# Altium footprint library UWRT_Footprint_Library_2020.PcbLib: 376 footprints (part 5 of 24)
Each footprint in its own frame and in the unit in brackets; x right, y up, seen from the top. Pads: shape width x height; smd on the part's side, far side on the other; paste and mask are expansions set on the pad; w line width, h text height; cw(c..) or ccw(c..) is an arc to the next point about the centre after c.
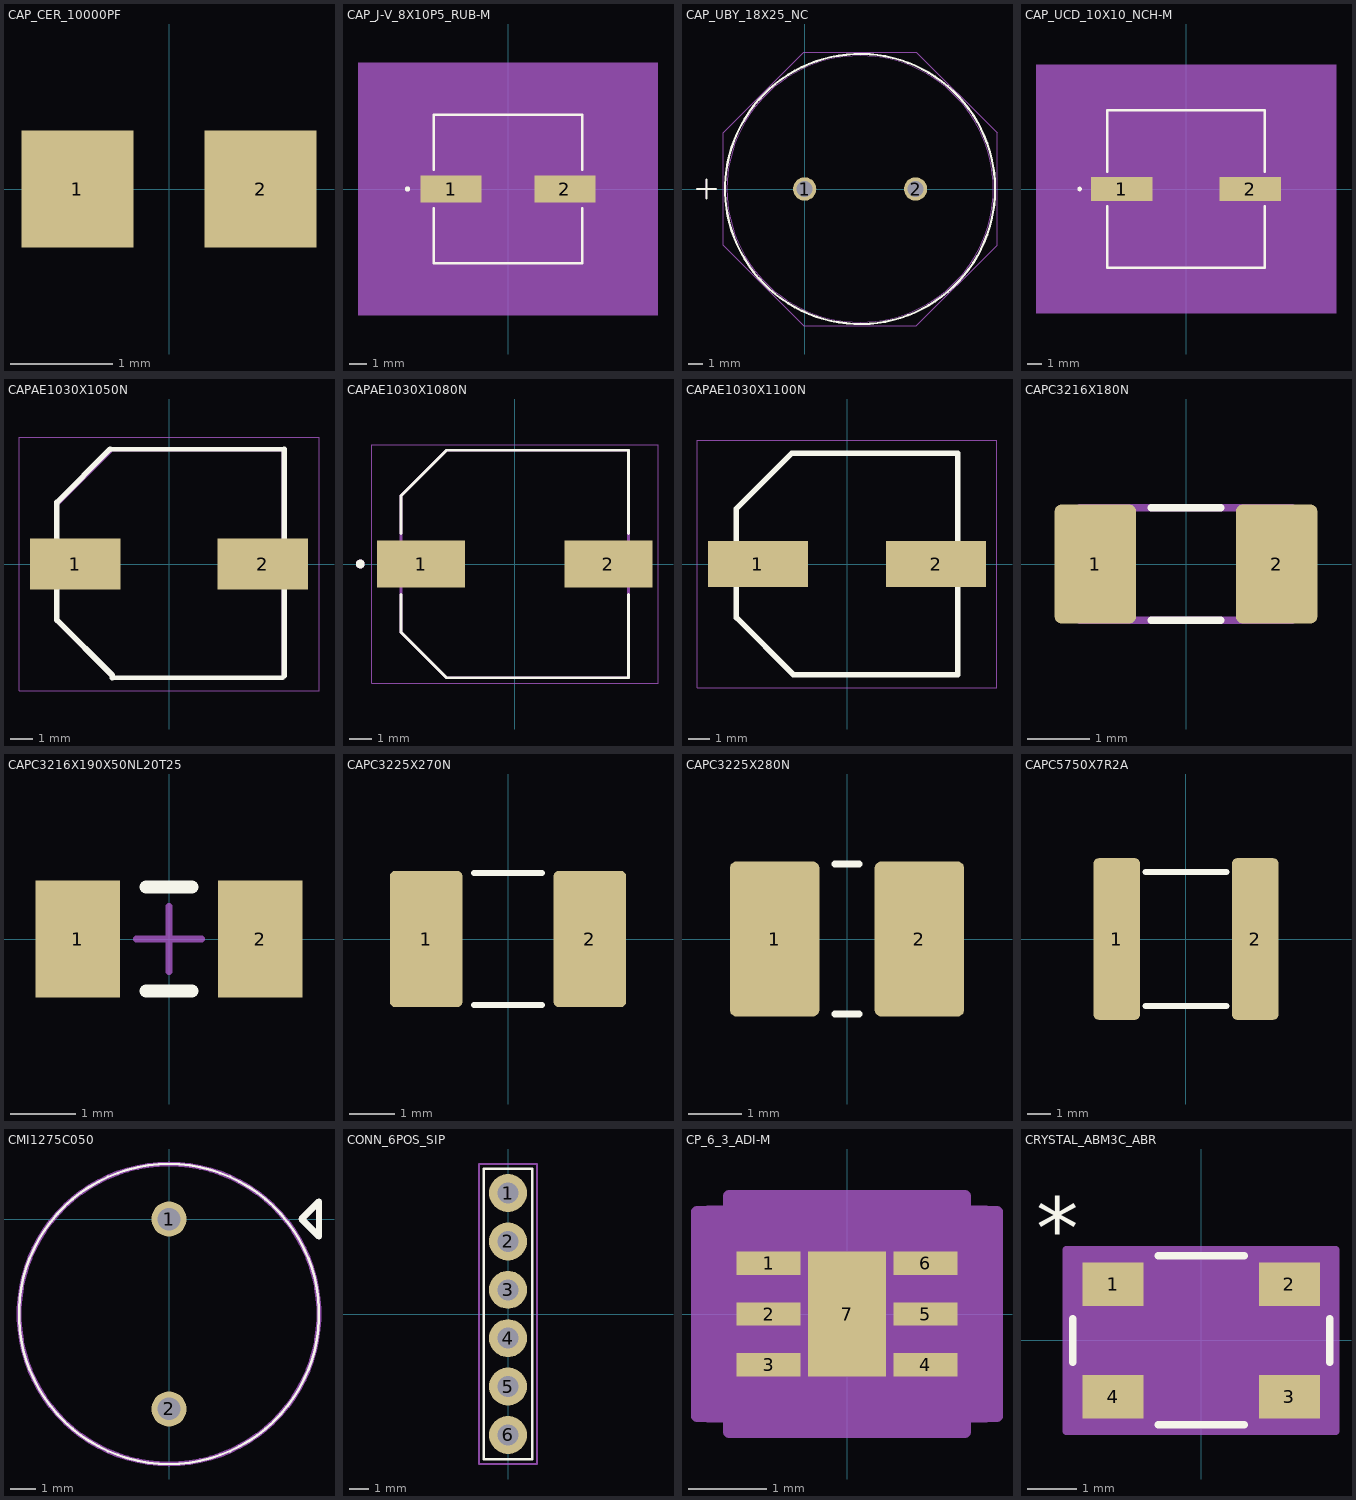
[diagram p4: the footprints below, top view; thin cyan lines are the x and y axes]

## CAP_CER_10000PF [mm] "CAP CER 10000PF 200V X7R 0603"
pads (2):
  rect 1.1x1.15 smd: 1(-0.9,0) 2(0.9,0)
3D body "C0603C103K2RECTU.step": height 0.96, standoff 0.01, extent -0.9,-0.445 0.85,0.425

## CAP_J-V_8X10P5_RUB-M [mil]
pads (2):
  rect 142x63 smd paste+0 mask+0: 1(-132,0) 2(132,0)
Top Overlay:
  circle w6: c-233,0 r3
  lines w6: -172.5,-44.6 -172.5,-172.5 172.5,-172.5 172.5,-44.6 ; -172.5,44.6 -172.5,172.5 172.5,172.5 172.5,44.6
Mechanical 5:
  region: 348,-292.5 -348,-292.5 -348,292.5 348,292.5
Mechanical 13:
  circle w0: c-147.5,0 r3
  lines w1: -167.5,-83.75 -83.75,-167.5 ; -167.5,83.75 -83.75,167.5 ; -167.5,-167.5 167.5,-167.5 167.5,167.5 -167.5,167.5 -167.5,-167.5
Mechanical 15:
  region: -187.5,-51.5 -223,-51.5 -223,51.5 -187.5,51.5 -187.5,187.5 187.5,187.5 187.5,51.5 223,51.5 223,-51.5 187.5,-51.5 187.5,-187.5 -187.5,-187.5
  lines w6: -223,-51.5 -223,51.5 -187.5,51.5 -187.5,187.5 187.5,187.5 187.5,51.5 223,51.5 223,-51.5 187.5,-51.5 187.5,-187.5 -187.5,-187.5 -187.5,-51.5 -223,-51.5
3D body "CAP_J-V_8X10P5_RUB.step": height 415.12, standoff 0, extent -175,-167.48 175,167.48

## CAP_UBY_18X25_NC [mil]
pads (2):
  round 62 hole 42 mask+0: 1(0,0) 2(295.28,0)
Top Overlay:
  circle w6: c147.64,0 r359.5
  lines w6: -286.55,0 -236.55,0 ; -261.55,-25 -261.55,25
Mechanical 13:
  circle w0: c147.64,0 r354.5
  lines w1: -261.55,-25 -261.55,25
Mechanical 15:
  lines w1: -216.86,-150.09 -216.86,150.09 -2.45,364.5 297.73,364.5 512.14,150.09 512.14,-150.09 297.73,-364.5 -2.45,-364.5 -216.86,-150.09
3D body: height 10, standoff 0, extent 0,0 10,10
3D body "CAP_UBY_18X25_NCH.step": height 1043.62, standoff -195.98, extent -207.46,-354.34 502.14,354.35

## CAP_UCD_10X10_NCH-M [mil]
pads (2):
  rect 162x63 smd paste+0 mask+0: 1(-169.5,0) 2(169.5,0)
Top Overlay:
  circle w6: c-280.5,0 r3
  lines w6: -208,-44.6 -208,-208 208,-208 208,-44.6 ; -208,44.6 -208,208 208,208 208,44.6
Mechanical 5:
  region: 395.5,-328 -395.5,-328 -395.5,328 395.5,328
Mechanical 13:
  circle w0: c-183,0 r3
  lines w1: -203,-101.5 -101.5,-203 ; -203,101.5 -101.5,203 ; -203,-203 203,-203 203,203 -203,203 -203,-203
Mechanical 15:
  region: -223,-51.5 -270.5,-51.5 -270.5,51.5 -223,51.5 -223,223 223,223 223,51.5 270.5,51.5 270.5,-51.5 223,-51.5 223,-223 -223,-223
  lines w6: -270.5,-51.5 -270.5,51.5 -223,51.5 -223,223 223,223 223,51.5 270.5,51.5 270.5,-51.5 223,-51.5 223,-223 -223,-223 -223,-51.5 -270.5,-51.5
3D body "CAP_UCD_10X10_NCH.step": height 415.12, standoff 0, extent -222.48,-202.99 222.48,202.99

## CAPAE1030X1050N [mm]
pads (2):
  rect 4.1x2.3 smd: 1(-4.25,0) 2(4.25,0)
Top Overlay:
  lines w0.2: -2.667,5.207 5.227,5.207 ; -2.575,-5.15 5.15,-5.15
  lines w0.254: -2.667,5.207 -5.08,2.794 -5.08,-2.54 -2.575,-5.045 -2.575,-5.15 ; 5.227,-5.073 5.227,5.207
Mechanical 13:
  lines w0.1: -5.15,-2.575 -2.575,-5.15 5.15,-5.15 5.15,5.15 -2.575,5.15 -5.15,2.575 -5.15,-2.575
Mechanical 15:
  lines w0.05: -6.8,-5.75 -6.8,5.75 6.8,5.75 6.8,-5.75 -6.8,-5.75
3D body "VE-102M1CTR-1010.stp": height 10.5, standoff 0, extent -5.6,-5.25 5.6,5.25

## CAPAE1030X1080N [mm]
pads (2):
  rect 3.99x2.12 smd: 1(-4.24,0) 2(4.24,0)
Top Overlay:
  circle w0.2: c-7,0 r0.1
  lines w0.127: -5.15,-1.38 -5.15,-3.09 -3.09,-5.15 5.15,-5.15 5.15,-1.38 ; -5.15,1.38 -5.15,3.09 -3.09,5.15 5.15,5.15 5.15,1.38
Mechanical 13:
  circle w0.2: c-7,0 r0.1
  lines w0.127: -5.15,-3.09 -3.09,-5.15 5.15,-5.15 5.15,5.15 -3.09,5.15 -5.15,3.09 -5.15,-3.09
Mechanical 15:
  lines w0.05: -6.485,-5.4 -6.485,5.4 6.485,5.4 6.485,-5.4 -6.485,-5.4
3D body "step_temp.STEP": height 10.8, standoff 0, extent -5.15,-5.45 5.15,5.45

## CAPAE1030X1100N [mm]
pads (2):
  rect 4.65x2.15 smd: 1(-4.15,0) 2(4.15,0)
Top Overlay:
  lines w0.254: 5.15,-5.15 -2.489,-5.15 -5.147,-2.492 -5.147,2.57 -2.58,5.137 -2.567,5.15 5.15,5.15 ; 5.15,-5.137 5.15,5.089
Mechanical 13:
  lines w0.1: -5.15,-2.575 -2.575,-5.15 5.15,-5.15 5.15,5.15 -2.575,5.15 -5.15,2.575 -5.15,-2.575
Mechanical 15:
  lines w0.05: -6.975,-5.75 -6.975,5.75 6.975,5.75 6.975,-5.75 -6.975,-5.75
3D body "RVT1V471M1010.stp": height 11, standoff 0, extent -5.75,-5.25 5.75,5.25

## CAPC3216X180N [mm]
pads (2):
  rrect15% 1.3x1.9 smd: 1(-1.45,0) 2(1.45,0)
Top Overlay:
  lines w0.127: -0.55,-0.9 0.55,-0.9 ; -0.55,0.9 0.55,0.9
Mechanical 4:
  lines w0.127: -1.7,-0.9 1.7,-0.9 ; -1.7,-0.9 -1.7,0.9 ; -1.7,-0.9 1.7,-0.9 ; -1.7,-0.9 -1.7,0.9 ; -1.7,0.9 1.7,0.9 ; -1.7,0.9 1.7,0.9 ; 1.7,-0.9 1.7,0.9 ; 1.7,-0.9 1.7,0.9
3D body "GJ831CR71H475KA12L--3DModel-STEP-46669.STEP": height 1.59, standoff -0.01, extent -1.6,-0.9 1.6,0.9

## CAPC3216X190X50NL20T25 [mm] "Chip Capacitor, 2-Leads, Body 3.20x1.60mm, IPC Medium Density"
height 1.9
pads (2):
  rect 1.3x1.8 smd: 1(-1.4,0) 2(1.4,0)
Top Overlay:
  lines w0.2: -0.35,-0.8 0.35,-0.8 ; -0.35,0.8 0.35,0.8
Mechanical 15:
  lines w0.1: -0.5,0 0.5,0 ; 0,-0.5 0,0.5
3D body "GJ831CR71H475KA12L--3DModel-STEP-46669.STEP": height 1.59, standoff -0.01, extent -1.6,-0.9 1.6,0.9

## CAPC3225X270N [mm]
pads (2):
  rrect15% 1.6x3 smd: 1(-1.8,0) 2(1.8,0)
Top Overlay:
  lines w0.127: -0.75,-1.45 0.75,-1.45 ; -0.75,1.45 0.75,1.45
3D body "GRT32EC81C476KE13L--3DModel-STEP-56544.STEP": height 2.55, standoff 0.05, extent -1.6,-1.35 1.6,1.35

## CAPC3225X280N [mm]
pads (2):
  rrect15% 1.675x2.9 smd: 1(-1.353,0) 2(1.353,0)
Top Overlay:
  lines w0.127: -0.23,-1.4 0.23,-1.4 ; -0.23,1.4 0.23,1.4
3D body "User Library-CAPC3225X13.step": height 1.3, standoff 0, extent -1.6,-1.25 1.6,1.25

## CAPC5750X7R2A [mm]
pads (2):
  rrect20% 2x7 smd: 1(-3,0) 2(3,0)
Top Overlay:
  lines w0.254: -1.75,-2.905 1.75,-2.905 ; -1.75,2.905 1.75,2.905
3D body "2220.stp": height 2.7, standoff 0, extent -2.91,-2.7 3.19,2.7

## CMI1275C050 [mm]
pads (2):
  round 1.4 hole 0.9: 1(0,0) 2(0,-7.6)
Top Overlay:
  lines w0.1: 0,-9.8 cw(c0,-3.8) 0,2.2 cw(c0,-3.8) 0,-9.8
  lines w0.254: 5.3,0 6,0.7 6,-0.7 5.3,0
Mechanical 13:
  lines w0.2: 0,-9.8 cw(c0,-3.8) 0,2.2 cw(c0,-3.8) 0,-9.8
3D body "CMI-1275C-050.stp": height 8.1, standoff -5, extent -6,-9.8 6,2.2

## CONN_6POS_SIP [mm]
pads (6):
  round 2 hole 1.1: 1(0,6.35) 2(0,3.81) 3(0,1.27) 4(0,-1.27) 5(0,-3.81) 6(0,-6.35)
Top Overlay:
  lines w0.127: -1.27,-7.62 -1.27,7.62 1.27,7.62 1.27,-7.62 -1.27,-7.62
Mechanical 15:
  lines w0.127: -1.524,-7.874 1.524,-7.874 1.524,7.874 -1.524,7.874 -1.524,-7.874
3D body "Pin Header 1x6 TH Pitch 2.54mm.stp": height 9.5, standoff -3.2, extent -1.27,-7.62 1.27,7.62

## CP_6_3_ADI-M [mil]
pads (7):
  rect 32x11.78 smd paste+0 mask+0: 1(-39.5,25.59) 2(-39.5,0) 3(-39.5,-25.59) 4(39.5,-25.59) 5(39.5,0) 6(39.5,25.59)
  rect 39.37x62.99 smd paste+0 mask+0: 7(0,0)
Mechanical 5:
  region: 70.5,-54.37 -70.5,-54.37 -70.5,54.37 70.5,54.37
Mechanical 13:
  lines w0: -12,39.37 ccw(c0,39.37) 12,39.37
  lines w1: -39.37,-39.37 -39.37,39.37 39.37,39.37 39.37,-39.37 -39.37,-39.37
Mechanical 15:
  region: -59.37,-51.48 -75.5,-51.48 -75.5,51.48 -59.37,51.48 -59.37,59.37 59.37,59.37 59.37,51.48 75.5,51.48 75.5,-51.48 59.37,-51.48 59.37,-59.37 -59.37,-59.37
  lines w6: -75.5,-51.48 -59.37,-51.48 -59.37,-59.37 59.37,-59.37 59.37,-51.48 75.5,-51.48 75.5,51.48 59.37,51.48 59.37,59.37 -59.37,59.37 -59.37,51.48 -75.5,51.48 -75.5,-51.48
3D body "CP_6_3_ADI.step": height 4.06, standoff 0, extent -39.49,-39.37 39.49,39.37

## CRYSTAL_ABM3C_ABR [mil]
pads (4):
  rect 49x35 smd paste+0 mask+0: 1(-71,45.28) 2(71,45.28) 3(71,-45.28) 4(-71,-45.28)
Top Overlay:
  lines w6: -103.5,-17.4 -103.5,17.4 ; -34.49,-68 34.49,-68 ; -34.49,68 34.49,68 ; 103.5,-17.4 103.5,17.4
  text "*" at -133,65.55 h50
Mechanical 13:
  lines w1: -98.5,13 -48.5,63 ; -98.5,-63 -98.5,63 98.5,63 98.5,-63 -98.5,-63 ; -98.5,-62.78 -95.5,-62.78 -95.5,-27.78 -98.5,-27.78 -98.5,-62.78 ; -98.5,27.78 -95.5,27.78 -95.5,62.78 -98.5,62.78 -98.5,27.78 ; 95.5,-62.78 95.5,-27.78 98.5,-27.78 98.5,-62.78 95.5,-62.78 ; 95.5,27.78 95.5,62.78 98.5,62.78 98.5,27.78 95.5,27.78
  text "*" at -59,65.55 h50
Mechanical 15:
  region: 17.78,-73 -108.5,-73 -108.5,-72.78 -108.5,72.78 -108.5,73 17.78,73 -17.78,73 108.5,73 108.5,72.78 108.5,-72.78 108.5,-73 -17.78,-73
  lines w6: -108.5,-73 17.78,-73 -17.78,-73 108.5,-73 108.5,-72.78 108.5,72.78 108.5,73 -17.78,73 17.78,73 -108.5,73 -108.5,72.78 -108.5,-72.78 -108.5,-73
3D body "CRYSTAL_ABM3C_ABR.step": height 51.1, standoff 0, extent -98.5,-62.99 98.5,62.99